# Altium footprint library Transformers.PcbLib: 81 footprints (part 3 of 6) (continued)
## XFMR_EDA-01905-V1-0_misc5 [mm] "ETD39 Core + Coil Former + Yoke" (continued)
3D body "XFMR_EDA-01905-V1-0_misc5.stp": height 35.5, standoff -4.5, extent -22.5,-23.64 22.6,23.4

## XFMR_EDA-02116-V1-0_misc1 [mm] "Transformer D40 x L 65.5"
height 40
Top Overlay:
  lines w0.2: -32.3,-11.45 -57.3,-11.45 -57.3,-7.75 -32.3,-7.75 ; -32.3,3.75 -42,3.75 -42,4.65 -32.3,4.65 ; -32.3,10.35 -42,10.35 -42,11.25 -32.3,11.25 ; -32.3,-20.25 33.3,-20.25 33.3,20.25 -32.3,20.25 -32.3,-20.25
  text "CATHODE" at -42,5.4 h1.5
  text "GATE" at -39.75,12 h1.5
Top Solder:
  lines w1.27: -23.5,-13.51 ccw(c-23,-13.51) -23,-14.01 -16,-14.01 ccw(c-16,-13.51) -15.5,-13.51 -15.5,-11.51 ccw(c-16,-11.51) -16,-11.01 -23,-11.01 ccw(c-23,-11.51) -23.5,-11.51 -23.5,-13.51 ; -23.5,11.49 ccw(c-23,11.49) -23,10.99 -16,10.99 ccw(c-16,11.49) -15.5,11.49 -15.5,13.49 ccw(c-16,13.49) -16,13.99 -23,13.99 ccw(c-23,13.49) -23.5,13.49 -23.5,11.49 ; 16.5,-13.51 ccw(c17,-13.51) 17,-14.01 24,-14.01 ccw(c24,-13.51) 24.5,-13.51 24.5,-11.51 ccw(c24,-11.51) 24,-11.01 17,-11.01 ccw(c17,-11.51) 16.5,-11.51 16.5,-13.51 ; 16.5,11.49 ccw(c17,11.49) 17,10.99 24,10.99 ccw(c24,11.49) 24.5,11.49 24.5,13.49 ccw(c24,13.49) 24,13.99 17,13.99 ccw(c17,13.49) 16.5,13.49 16.5,11.49
Bottom Solder:
  lines w1.27: -23.5,-13.51 ccw(c-23,-13.51) -23,-14.01 -16,-14.01 ccw(c-16,-13.51) -15.5,-13.51 -15.5,-11.51 ccw(c-16,-11.51) -16,-11.01 -23,-11.01 ccw(c-23,-11.51) -23.5,-11.51 -23.5,-13.51 ; -23.5,11.49 ccw(c-23,11.49) -23,10.99 -16,10.99 ccw(c-16,11.49) -15.5,11.49 -15.5,13.49 ccw(c-16,13.49) -16,13.99 -23,13.99 ccw(c-23,13.49) -23.5,13.49 -23.5,11.49 ; 16.5,-13.51 ccw(c17,-13.51) 17,-14.01 24,-14.01 ccw(c24,-13.51) 24.5,-13.51 24.5,-11.51 ccw(c24,-11.51) 24,-11.01 17,-11.01 ccw(c17,-11.51) 16.5,-11.51 16.5,-13.51 ; 16.5,11.49 ccw(c17,11.49) 17,10.99 24,10.99 ccw(c24,11.49) 24.5,11.49 24.5,13.49 ccw(c24,13.49) 24,13.99 17,13.99 ccw(c17,13.49) 16.5,13.49 16.5,11.49
Keep-Out Layer:
  board cut-out: -23,11 -23.099,11 -23.283,11.076 -23.424,11.217 -23.5,11.401 -23.5,11.5 -23.5,13.5 -23.5,13.599 -23.424,13.783 -23.283,13.924 -23.099,14 -23,14 -16,14 -15.901,14 -15.717,13.924 -15.576,13.783 -15.5,13.599 -15.5,13.5 -15.5,11.5 -15.5,11.401 -15.576,11.217 -15.717,11.076 -15.901,11 -16,11
  board cut-out: 17,11 16.901,11 16.717,11.076 16.576,11.217 16.5,11.401 16.5,11.5 16.5,13.5 16.5,13.599 16.576,13.783 16.717,13.924 16.901,14 17,14 24,14 24.099,14 24.283,13.924 24.424,13.783 24.5,13.599 24.5,13.5 24.5,11.5 24.5,11.401 24.424,11.217 24.283,11.076 24.099,11 24,11
  board cut-out: 17,-14 16.901,-14 16.717,-13.924 16.576,-13.783 16.5,-13.599 16.5,-13.5 16.5,-11.5 16.5,-11.401 16.576,-11.217 16.717,-11.076 16.901,-11 17,-11 24,-11 24.099,-11 24.283,-11.076 24.424,-11.217 24.5,-11.401 24.5,-11.5 24.5,-13.5 24.5,-13.599 24.424,-13.783 24.283,-13.924 24.099,-14 24,-14
  board cut-out: -23,-14 -23.099,-14 -23.283,-13.924 -23.424,-13.783 -23.5,-13.599 -23.5,-13.5 -23.5,-11.5 -23.5,-11.401 -23.424,-11.217 -23.283,-11.076 -23.099,-11 -23,-11 -16,-11 -15.901,-11 -15.717,-11.076 -15.576,-11.217 -15.5,-11.401 -15.5,-11.5 -15.5,-13.5 -15.5,-13.599 -15.576,-13.783 -15.717,-13.924 -15.901,-14 -16,-14
Mechanical 1:
  lines w1.27: -23.5,-13.5 ccw(c-23,-13.5) -23,-14 -16,-14 ccw(c-16,-13.5) -15.5,-13.5 -15.5,-11.5 ccw(c-16,-11.5) -16,-11 -23,-11 ccw(c-23,-11.5) -23.5,-11.5 -23.5,-13.5 ; -23.5,11.5 ccw(c-23,11.5) -23,11 -16,11 ccw(c-16,11.5) -15.5,11.5 -15.5,13.5 ccw(c-16,13.5) -16,14 -23,14 ccw(c-23,13.5) -23.5,13.5 -23.5,11.5 ; 16.5,-13.5 ccw(c17,-13.5) 17,-14 24,-14 ccw(c24,-13.5) 24.5,-13.5 24.5,-11.5 ccw(c24,-11.5) 24,-11 17,-11 ccw(c17,-11.5) 16.5,-11.5 16.5,-13.5 ; 16.5,11.5 ccw(c17,11.5) 17,11 24,11 ccw(c24,11.5) 24.5,11.5 24.5,13.5 ccw(c24,13.5) 24,14 17,14 ccw(c17,13.5) 16.5,13.5 16.5,11.5
Mechanical 8:
  lines w0.1: -20,-12.5 -19.5,-12.5 ; -20,12.5 -19.5,12.5 ; -19.5,-13 -19.5,-12.5 ; -19.5,-12 -19.5,-12.5 ; -19.5,12 -19.5,12.5 ; -19.5,13 -19.5,12.5 ; -19,-12.5 -19.5,-12.5 ; -19,12.5 -19.5,12.5 ; -0.5,0 0,0 ; 0,-0.5 0,0 ; 0,0.5 0,0 ; 0.5,0 0,0 ; 20,-12.5 20.5,-12.5 ; 20,12.5 20.5,12.5 ; 20.5,-13 20.5,-12.5 ; 20.5,-12 20.5,-12.5 ; 20.5,12 20.5,12.5 ; 20.5,13 20.5,12.5 ; 21,-12.5 20.5,-12.5 ; 21,12.5 20.5,12.5
Mechanical 14:
  lines w0.1: -32.3,-11.45 -57.3,-11.45 -57.3,-7.75 -32.3,-7.75 ; -32.3,3.75 -42,3.75 -42,4.65 -32.3,4.65 ; -32.3,10.35 -42,10.35 -42,11.25 -32.3,11.25 ; -32.3,-20.25 33.3,-20.25 33.3,20.25 -32.3,20.25 -32.3,-20.25 ; -23.5,-13.5 ccw(c-23,-13.5) -23,-14 -16,-14 ccw(c-16,-13.5) -15.5,-13.5 -15.5,-11.5 ccw(c-16,-11.5) -16,-11 -23,-11 ccw(c-23,-11.5) -23.5,-11.5 -23.5,-13.5 ; -23.5,11.5 ccw(c-23,11.5) -23,11 -16,11 ccw(c-16,11.5) -15.5,11.5 -15.5,13.5 ccw(c-16,13.5) -16,14 -23,14 ccw(c-23,13.5) -23.5,13.5 -23.5,11.5 ; 16.5,-13.5 ccw(c17,-13.5) 17,-14 24,-14 ccw(c24,-13.5) 24.5,-13.5 24.5,-11.5 ccw(c24,-11.5) 24,-11 17,-11 ccw(c17,-11.5) 16.5,-11.5 16.5,-13.5 ; 16.5,11.5 ccw(c17,11.5) 17,11 24,11 ccw(c24,11.5) 24.5,11.5 24.5,13.5 ccw(c24,13.5) 24,14 17,14 ccw(c17,13.5) 16.5,13.5 16.5,11.5
  text "CATHODE" at -42,5.4 h1.5
  text "GATE" at -39.75,12 h1.5
Drill Drawing:
  lines w0.1: -28.5,-12.5 -20.5,-12.5 ; -28.5,12.5 -20.5,12.5 ; -27.842,-11.56 -27.5,-12.5 ; -27.842,11.56 -27.5,12.5 ; -27.158,-11.56 -27.5,-12.5 ; -27.158,11.56 -27.5,12.5 ; -20,-12.5 -19.5,-12.5 ; -20,12.5 -19.5,12.5 ; -19.5,-18.5 -19.5,-13.5 ; -19.5,-13 -19.5,-12.5 ; -19.5,-12 -19.5,-12.5 ; -19.5,-11.5 -19.5,11.5 ; -19.5,12 -19.5,12.5 ; -19.5,13 -19.5,12.5 ; -19,-12.5 -19.5,-12.5 ; -19,12.5 -19.5,12.5 ; -18.56,-17.842 -19.5,-17.5 ; -18.56,-17.158 -19.5,-17.5 ; -18.5,-12.5 19.5,-12.5 ; -18.5,12.5 19.5,12.5 ; -0.5,0 0,0 ; 0,-0.5 0,0 ; 0,0.5 0,0 ; 0.5,0 0,0 ; 14.5,11 16.5,11 ; 14.5,14 16.5,14 16.5,16 ; 14.658,10.06 15,11 15.342,10.06 ; 14.658,14.94 15,14 15.342,14.94 ; 15,10.06 15,14.94 ; 15.56,15.158 16.5,15.5 15.56,15.842 ; 15.56,15.5 25.44,15.5 ; 19.56,-17.842 20.5,-17.5 ; 19.56,-17.158 20.5,-17.5 ; 20,-12.5 20.5,-12.5 ; 20,12.5 20.5,12.5 ; 20.5,-18.5 20.5,-13.5 ; 20.5,-13 20.5,-12.5 ; 20.5,-12 20.5,-12.5 ; 20.5,-11.5 20.5,11.5 ; 20.5,12 20.5,12.5 ; 20.5,13 20.5,12.5 ; 21,-12.5 20.5,-12.5 ; 21,12.5 20.5,12.5 ; 23.447,11.569 24.354,11.146 ; 23.931,12.053 24.354,11.146 ; 24.5,14 24.5,16 ; 25.44,15.158 24.5,15.5 25.44,15.842 ; 27.636,12.598 22.902,12.598 24.354,11.146 ; -27.5,-12.5 -27.5,12.5 ; -19.5,-17.5 20.5,-17.5 ; -23.5,-13.5 ccw(c-23,-13.5) -23,-14 -16,-14 ccw(c-16,-13.5) -15.5,-13.5 -15.5,-11.5 ccw(c-16,-11.5) -16,-11 -23,-11 ccw(c-23,-11.5) -23.5,-11.5 -23.5,-13.5 ; -23.5,11.5 ccw(c-23,11.5) -23,11 -16,11 ccw(c-16,11.5) -15.5,11.5 -15.5,13.5 ccw(c-16,13.5) -16,14 -23,14 ccw(c-23,13.5) -23.5,13.5 -23.5,11.5 ; 16.5,-13.5 ccw(c17,-13.5) 17,-14 24,-14 ccw(c24,-13.5) 24.5,-13.5 24.5,-11.5 ccw(c24,-11.5) 24,-11 17,-11 ccw(c17,-11.5) 16.5,-11.5 16.5,-13.5 ; 16.5,11.5 ccw(c17,11.5) 17,11 24,11 ccw(c24,11.5) 24.5,11.5 24.5,13.5 ccw(c24,13.5) 24,14 17,14 ccw(c17,13.5) 16.5,13.5 16.5,11.5
  text "3" at 14.741,11.395 h1
  text "8" at 20.15,15.759 h1
  text "r0.5" at 25.074,12.807 h1
  text "25" at -27.759,-0.708 h1
  text "40" at -0.25,-17.241 h1
3D body "XFMR_EDA-02116_misc1.stp": height 41.07, standoff -8, extent -64.15,-20.25 33.3,28.71

## XFMR_EDA-03141-V2-0_misc1 [mm]
height 9.8
pads (4):
  round 3.3 hole 2.6: 1(-10,0) 2(10,0)
  round 2 hole 1.3: 3(-22.5,0) 4(22.5,0)
Top Overlay:
  lines w0.2: -21.5,-1.118 -21.5,-1.4 -11.632,-1.4 ; -21.5,1.118 -21.5,1.4 -11.632,1.4 ; -9.211,-2 -8.5,-2 ; -9.211,2 -8.5,2 ; -8.5,-1.54 -8.5,-2.5 -6.95,-2.5 ; -8.5,1.54 -8.5,2.5 -6.95,2.5 ; -3.55,-2.5 -3.45,-2.5 ; -3.55,2.5 -3.45,2.5 ; -0.05,-2.5 0.05,-2.5 ; -0.05,2.5 0.05,2.5 ; 3.45,-2.5 3.55,-2.5 ; 3.45,2.5 3.55,2.5 ; 6.95,-2.5 8.5,-2.5 8.5,-1.54 ; 6.95,2.5 8.5,2.5 8.5,1.54 ; 8.5,-2 9.211,-2 ; 8.5,2 9.211,2 ; 11.632,-1.4 21.5,-1.4 21.5,-1.118 ; 11.632,1.4 21.5,1.4 21.5,1.118 ; -6.95,-4.45 ccw(c-6.65,-4.45) -6.65,-4.75 -3.85,-4.75 ccw(c-3.85,-4.45) -3.55,-4.45 -3.55,4.45 ccw(c-3.85,4.45) -3.85,4.75 -6.65,4.75 ccw(c-6.65,4.45) -6.95,4.45 -6.95,-4.45 ; -3.45,-4.45 ccw(c-3.15,-4.45) -3.15,-4.75 -0.35,-4.75 ccw(c-0.35,-4.45) -0.05,-4.45 -0.05,4.45 ccw(c-0.35,4.45) -0.35,4.75 -3.15,4.75 ccw(c-3.15,4.45) -3.45,4.45 -3.45,-4.45 ; 0.05,-4.45 ccw(c0.35,-4.45) 0.35,-4.75 3.15,-4.75 ccw(c3.15,-4.45) 3.45,-4.45 3.45,4.45 ccw(c3.15,4.45) 3.15,4.75 0.35,4.75 ccw(c0.35,4.45) 0.05,4.45 0.05,-4.45 ; 3.55,-4.45 ccw(c3.85,-4.45) 3.85,-4.75 6.65,-4.75 ccw(c6.65,-4.45) 6.95,-4.45 6.95,4.45 ccw(c6.65,4.45) 6.65,4.75 3.85,4.75 ccw(c3.85,4.45) 3.55,4.45 3.55,-4.45
  text "1" at -10.35,2.8 h1.5
  text "3" at -20.75,-0.7 h1.5
  text "2" at 9.65,2.8 h1.5
  text "4" at 19.65,-0.7 h1.5
Mechanical 8:
  circle w0.1: c-10,0 r1.3
  circle w0.1: c-22.5,0 r0.65
  circle w0.1: c10,0 r1.3
  circle w0.1: c22.5,0 r0.65
  circle w0.1: c22.5,0 r1
  circle w0.1: c-22.5,0 r1
  circle w0.1: c-10,0 r1.65
  circle w0.1: c10,0 r1.65
  lines w0.1: -23,0 -22.5,0 ; -22.5,-0.5 -22.5,0 ; -22.5,0.5 -22.5,0 ; -22,0 -22.5,0 ; -10.5,0 -10,0 ; -10,-0.5 -10,0 ; -10,0.5 -10,0 ; -9.5,0 -10,0 ; -0.5,0 0,0 ; 0,-0.5 0,0 ; 0,0.5 0,0 ; 0.5,0 0,0 ; 9.5,0 10,0 ; 10,-0.5 10,0 ; 10,0.5 10,0 ; 10.5,0 10,0 ; 22,0 22.5,0 ; 22.5,-0.5 22.5,0 ; 22.5,0.5 22.5,0 ; 23,0 22.5,0
Mechanical 14:
  lines w0.1: -21.5,-0.5 -22.5,-0.5 cw(c-22.5,0) -22.5,0.5 -21.5,0.5 ; -9.9,-1.4 -21.5,-1.4 -21.5,1.4 -9.9,1.4 ; -8.5,-2 -9.9,-2 -9.9,2 -8.5,2 ; -6.95,-2.5 -8.5,-2.5 -8.5,2.5 -6.95,2.5 ; -3.55,-2.5 -3.45,-2.5 ; -3.55,2.5 -3.45,2.5 ; -0.05,-2.5 0.05,-2.5 ; -0.05,2.5 0.05,2.5 ; 3.45,-2.5 3.55,-2.5 ; 3.45,2.5 3.55,2.5 ; 6.95,-2.5 8.5,-2.5 8.5,2.5 6.95,2.5 ; 8.5,-2 9.9,-2 9.9,2 8.5,2 ; 9.9,-1.4 21.5,-1.4 21.5,1.4 9.9,1.4 ; 21.5,-0.5 22.5,-0.5 ccw(c22.5,0) 22.5,0.5 21.5,0.5 ; -6.95,-4.45 ccw(c-6.65,-4.45) -6.65,-4.75 -3.85,-4.75 ccw(c-3.85,-4.45) -3.55,-4.45 -3.55,4.45 ccw(c-3.85,4.45) -3.85,4.75 -6.65,4.75 ccw(c-6.65,4.45) -6.95,4.45 -6.95,-4.45 ; -3.45,-4.45 ccw(c-3.15,-4.45) -3.15,-4.75 -0.35,-4.75 ccw(c-0.35,-4.45) -0.05,-4.45 -0.05,4.45 ccw(c-0.35,4.45) -0.35,4.75 -3.15,4.75 ccw(c-3.15,4.45) -3.45,4.45 -3.45,-4.45 ; 0.05,-4.45 ccw(c0.35,-4.45) 0.35,-4.75 3.15,-4.75 ccw(c3.15,-4.45) 3.45,-4.45 3.45,4.45 ccw(c3.15,4.45) 3.15,4.75 0.35,4.75 ccw(c0.35,4.45) 0.05,4.45 0.05,-4.45 ; 3.55,-4.45 ccw(c3.85,-4.45) 3.85,-4.75 6.65,-4.75 ccw(c6.65,-4.45) 6.95,-4.45 6.95,4.45 ccw(c6.65,4.45) 6.65,4.75 3.85,4.75 ccw(c3.85,4.45) 3.55,4.45 3.55,-4.45
  text "1" at -10.35,2.8 h1.5
  text "3" at -20.75,-0.7 h1.5
  text "2" at 9.65,2.8 h1.5
  text "4" at 19.65,-0.7 h1.5
3D body "XFMR_EDA-03141-V1-0_misc1.stp": height 9.49, standoff -3.6, extent -22.996,-4.712 22.996,4.75

## XFMR_EDA-03141-V2-0_misc1_a [mm]
height 9.8
pads (2):
  round 3.3 hole 2.6: 1(-10,0) 2(10,0)
Top Overlay:
  lines w0.2: -21.5,-0.5 ccw(c-21.5,-1) -22,-1 -22,-8.35 -23,-8.35 -23,-1 cw(c-21.5,-1) -21.5,0.5 ; -11.632,-1.4 -21.5,-1.4 -21.5,1.4 -11.632,1.4 ; -9.211,-2 -8.5,-2 ; -9.211,2 -8.5,2 ; -8.5,-1.54 -8.5,-2.5 -6.95,-2.5 ; -8.5,1.54 -8.5,2.5 -6.95,2.5 ; -3.55,-2.5 -3.45,-2.5 ; -3.55,2.5 -3.45,2.5 ; -0.05,-2.5 0.05,-2.5 ; -0.05,2.5 0.05,2.5 ; 3.45,-2.5 3.55,-2.5 ; 3.45,2.5 3.55,2.5 ; 6.95,-2.5 8.5,-2.5 8.5,-1.54 ; 6.95,2.5 8.5,2.5 8.5,1.54 ; 8.5,-2 9.211,-2 ; 8.5,2 9.211,2 ; 11.632,-1.4 21.5,-1.4 21.5,1.4 11.632,1.4 ; 21.5,-0.5 cw(c21.5,-1) 22,-1 22,-8.35 23,-8.35 23,-1 ccw(c21.5,-1) 21.5,0.5 ; -6.95,-4.45 ccw(c-6.65,-4.45) -6.65,-4.75 -3.85,-4.75 ccw(c-3.85,-4.45) -3.55,-4.45 -3.55,4.45 ccw(c-3.85,4.45) -3.85,4.75 -6.65,4.75 ccw(c-6.65,4.45) -6.95,4.45 -6.95,-4.45 ; -3.45,-4.45 ccw(c-3.15,-4.45) -3.15,-4.75 -0.35,-4.75 ccw(c-0.35,-4.45) -0.05,-4.45 -0.05,4.45 ccw(c-0.35,4.45) -0.35,4.75 -3.15,4.75 ccw(c-3.15,4.45) -3.45,4.45 -3.45,-4.45 ; 0.05,-4.45 ccw(c0.35,-4.45) 0.35,-4.75 3.15,-4.75 ccw(c3.15,-4.45) 3.45,-4.45 3.45,4.45 ccw(c3.15,4.45) 3.15,4.75 0.35,4.75 ccw(c0.35,4.45) 0.05,4.45 0.05,-4.45 ; 3.55,-4.45 ccw(c3.85,-4.45) 3.85,-4.75 6.65,-4.75 ccw(c6.65,-4.45) 6.95,-4.45 6.95,4.45 ccw(c6.65,4.45) 6.65,4.75 3.85,4.75 ccw(c3.85,4.45) 3.55,4.45 3.55,-4.45
  text "1" at -10.35,2.8 h1.5
  text "2" at 9.65,2.8 h1.5
Mechanical 8:
  circle w0.1: c-10,0 r1.3
  circle w0.1: c10,0 r1.3
  circle w0.1: c-10,0 r1.65
  circle w0.1: c10,0 r1.65
  lines w0.1: -10.5,0 -10,0 ; -10,-0.5 -10,0 ; -10,0.5 -10,0 ; -9.5,0 -10,0 ; -0.5,0 0,0 ; 0,-0.5 0,0 ; 0,0.5 0,0 ; 0.5,0 0,0 ; 9.5,0 10,0 ; 10,-0.5 10,0 ; 10,0.5 10,0 ; 10.5,0 10,0
Mechanical 14:
  lines w0.1: -21.5,-0.5 ccw(c-21.5,-1) -22,-1 -22,-8.35 -23,-8.35 -23,-1 cw(c-21.5,-1) -21.5,0.5 ; -9.9,-1.4 -21.5,-1.4 -21.5,1.4 -9.9,1.4 ; -8.5,-2 -9.9,-2 -9.9,2 -8.5,2 ; -6.95,-2.5 -8.5,-2.5 -8.5,2.5 -6.95,2.5 ; -3.55,-2.5 -3.45,-2.5 ; -3.55,2.5 -3.45,2.5 ; -0.05,-2.5 0.05,-2.5 ; -0.05,2.5 0.05,2.5 ; 3.45,-2.5 3.55,-2.5 ; 3.45,2.5 3.55,2.5 ; 6.95,-2.5 8.5,-2.5 8.5,2.5 6.95,2.5 ; 8.5,-2 9.9,-2 9.9,2 8.5,2 ; 9.9,-1.4 21.5,-1.4 21.5,1.4 9.9,1.4 ; 21.5,-0.5 cw(c21.5,-1) 22,-1 22,-8.35 23,-8.35 23,-1 ccw(c21.5,-1) 21.5,0.5 ; -6.95,-4.45 ccw(c-6.65,-4.45) -6.65,-4.75 -3.85,-4.75 ccw(c-3.85,-4.45) -3.55,-4.45 -3.55,4.45 ccw(c-3.85,4.45) -3.85,4.75 -6.65,4.75 ccw(c-6.65,4.45) -6.95,4.45 -6.95,-4.45 ; -3.45,-4.45 ccw(c-3.15,-4.45) -3.15,-4.75 -0.35,-4.75 ccw(c-0.35,-4.45) -0.05,-4.45 -0.05,4.45 ccw(c-0.35,4.45) -0.35,4.75 -3.15,4.75 ccw(c-3.15,4.45) -3.45,4.45 -3.45,-4.45 ; 0.05,-4.45 ccw(c0.35,-4.45) 0.35,-4.75 3.15,-4.75 ccw(c3.15,-4.45) 3.45,-4.45 3.45,4.45 ccw(c3.15,4.45) 3.15,4.75 0.35,4.75 ccw(c0.35,4.45) 0.05,4.45 0.05,-4.45 ; 3.55,-4.45 ccw(c3.85,-4.45) 3.85,-4.75 6.65,-4.75 ccw(c6.65,-4.45) 6.95,-4.45 6.95,4.45 ccw(c6.65,4.45) 6.65,4.75 3.85,4.75 ccw(c3.85,4.45) 3.55,4.45 3.55,-4.45
  text "1" at -10.35,2.8 h1.5
  text "2" at 9.65,2.8 h1.5
3D body "XFMR_EDA-03141-V1-0_misc1_a.stp": height 9.49, standoff -3.6, extent -22.996,-8.35 22.996,4.75

## XFMR_ERA_030-7234.0 [mm] "EI30/10.5 1VA Low Power Encapsulated Transformer"
height 22.8
pads (4):
  round 1.8 hole 1.1: 1(-10,10) 5(-10,-10) 7(10,-5) 9(10,5)
Top Overlay:
  circle w0.3: c6,-3 r0.15
  circle w0.3: c-6,5 r0.15
  lines w0.2: -7,-7.5 -7,-3.75 ccw(c-7,-3) -7,-2.25 ccw(c-7,-1.5) -7,-0.75 ccw(c-7,0) -7,0.75 ccw(c-7,1.5) -7,2.25 ccw(c-7,3) -7,3.75 -7,7.5 ; -0.5,-5 -0.5,5 ; 0.5,-5 0.5,5 ; 7,-3.5 7,-2.25 cw(c7,-1.5) 7,-0.75 cw(c7,0) 7,0.75 cw(c7,1.5) 7,2.25 7,3.5 ; -13.9,-15.4 ccw(c-12.9,-15.4) -12.9,-16.4 12.9,-16.4 ccw(c12.9,-15.4) 13.9,-15.4 13.9,15.4 ccw(c12.9,15.4) 12.9,16.4 -12.9,16.4 ccw(c-12.9,15.4) -13.9,15.4 -13.9,-15.4
  text "5" at -6.25,-10.5 h1.5
  text "1" at -6.25,9.8 h1.5
  text "7" at 7.75,-6.5 h1.5
  text "9" at 7.75,5.55 h1.5
  text "SEC" at 5.5,-1.4 h1.2
  text "PRIM" at -4.3,-1.7 h1.2
Mechanical 8:
  lines w0.05: -10.5,-10 -10,-10 ; -10.5,10 -10,10 ; -10,-10.5 -10,-10 ; -10,-9.5 -10,-10 ; -10,9.5 -10,10 ; -10,10.5 -10,10 ; -9.5,-10 -10,-10 ; -9.5,10 -10,10 ; 9.5,-5 10,-5 ; 9.5,5 10,5 ; 10,-5.5 10,-5 ; 10,-4.5 10,-5 ; 10,4.5 10,5 ; 10,5.5 10,5 ; 10.5,-5 10,-5 ; 10.5,5 10,5
  lines w0.1: -0.5,0 0,0 ; 0,-0.5 0,0 ; 0,0.5 0,0 ; 0.5,0 0,0
Mechanical 14:
  circle w0.3: c6,-3 r0.15
  circle w0.3: c-6,5 r0.15
  lines w0.1: -7,-7.5 -7,-3.75 ccw(c-7,-3) -7,-2.25 ccw(c-7,-1.5) -7,-0.75 ccw(c-7,0) -7,0.75 ccw(c-7,1.5) -7,2.25 ccw(c-7,3) -7,3.75 -7,7.5 ; -0.5,-5 -0.5,5 ; 0.5,-5 0.5,5 ; 7,-3.5 7,-2.25 cw(c7,-1.5) 7,-0.75 cw(c7,0) 7,0.75 cw(c7,1.5) 7,2.25 7,3.5 ; -13.9,-15.4 ccw(c-12.9,-15.4) -12.9,-16.4 12.9,-16.4 ccw(c12.9,-15.4) 13.9,-15.4 13.9,15.4 ccw(c12.9,15.4) 12.9,16.4 -12.9,16.4 ccw(c-12.9,15.4) -13.9,15.4 -13.9,-15.4 ; -9.3,-10.8 ccw(c-8.3,-10.8) -8.3,-11.8 8.3,-11.8 ccw(c8.3,-10.8) 9.3,-10.8 9.3,10.8 ccw(c8.3,10.8) 8.3,11.8 -8.3,11.8 ccw(c-8.3,10.8) -9.3,10.8 -9.3,-10.8
  text "9" at 7.75,5.55 h1.5
  text "7" at 7.75,-6.5 h1.5
  text "1" at -6.25,9.8 h1.5
  text "5" at -6.25,-10.5 h1.5
  text "SEC" at 5.5,-1.4 h1.2
  text "PRIM" at -4.3,-1.7 h1.2
3D body "XFMR_ERA_030-7234.0.stp": height 22.8, standoff -3.5, extent -13.9,-16.4 13.9,16.4

## XFMR_ERA_054-5205.0 [mm] "ERA EI54/18.8 16VA Low Power Encapsulated Transformer, Body 57.1mm x 48mm"
height 39.1
pads (6):
  round 1.8 hole 1.1: 1(-15,15.12) 7(-15,-15.12) 8(15,-15.12) 9(15,-10.08) 13(15,10.08) 14(15,15.12)
Top Overlay:
  circle w0.3: c-11,6 r0.15
  circle w0.3: c11,-6 r0.15
  lines w0.2: -16,-16.736 -16,-20.55 16,-20.55 16,-16.736 ; -16,-13.505 -16,13.504 ; -16,16.735 -16,20.55 16,20.55 16,16.735 ; -12,-13.5 -12,-5.25 ccw(c-12,-4.5) -12,-3.75 ccw(c-12,-3) -12,-2.25 ccw(c-12,-1.5) -12,-0.75 ccw(c-12,0) -12,0.75 ccw(c-12,1.5) -12,2.25 ccw(c-12,3) -12,3.75 ccw(c-12,4.5) -12,5.25 -12,13.5 ; -0.5,-5 -0.5,5 ; 0.5,-5 0.5,5 ; 12,-8.5 12,-5.25 cw(c12,-4.5) 12,-3.75 cw(c12,-3) 12,-2.25 cw(c12,-1.5) 12,-0.75 cw(c12,0) 12,0.75 cw(c12,1.5) 12,2.25 cw(c12,3) 12,3.75 cw(c12,4.5) 12,5.25 12,8.5 ; 16,-13.505 16,-11.696 ; 16,-8.465 16,8.464 ; 16,11.695 16,13.504 ; -24,-27.55 ccw(c-23,-27.55) -23,-28.55 23,-28.55 ccw(c23,-27.55) 24,-27.55 24,27.55 ccw(c23,27.55) 23,28.55 -23,28.55 ccw(c-23,27.55) -24,27.55 -24,-27.55
  text "SEC" at 10.4,-1.6 h1.2
  text "14" at 11.8,14.6 h1
  text "13" at 11.8,9.6 h1
  text "9" at 12.5,-10.6 h1
  text "8" at 12.5,-15.6 h1
  text "7" at -13.2,-15.64 h1
  text "1" at -13.2,14.6 h1
  text "PRIM" at -9.3,-1.6 h1.2
Mechanical 8:
  lines w0.05: -15.5,-15.12 -15,-15.12 ; -15.5,15.12 -15,15.12 ; -15,-15.62 -15,-15.12 ; -15,-14.62 -15,-15.12 ; -15,14.62 -15,15.12 ; -15,15.62 -15,15.12 ; -14.5,-15.12 -15,-15.12 ; -14.5,15.12 -15,15.12 ; -1,0 1,0 ; 0,-1 0,1 ; 14.5,-15.12 15,-15.12 ; 14.5,-10.08 15,-10.08 ; 14.5,10.08 15,10.08 ; 14.5,15.12 15,15.12 ; 15,-15.62 15,-15.12 ; 15,-14.62 15,-15.12 ; 15,-10.58 15,-10.08 ; 15,-9.58 15,-10.08 ; 15,9.58 15,10.08 ; 15,10.58 15,10.08 ; 15,14.62 15,15.12 ; 15,15.62 15,15.12 ; 15.5,-15.12 15,-15.12 ; 15.5,-10.08 15,-10.08 ; 15.5,10.08 15,10.08 ; 15.5,15.12 15,15.12
Mechanical 14:
  circle w0.3: c11,-6 r0.15
  circle w0.3: c-11,6 r0.15
  lines w0.1: -12,-13.5 -12,-5.25 ccw(c-12,-4.5) -12,-3.75 ccw(c-12,-3) -12,-2.25 ccw(c-12,-1.5) -12,-0.75 ccw(c-12,0) -12,0.75 ccw(c-12,1.5) -12,2.25 ccw(c-12,3) -12,3.75 ccw(c-12,4.5) -12,5.25 -12,13.5 ; 12,-8.5 12,-5.25 cw(c12,-4.5) 12,-3.75 cw(c12,-3) 12,-2.25 cw(c12,-1.5) 12,-0.75 cw(c12,0) 12,0.75 cw(c12,1.5) 12,2.25 cw(c12,3) 12,3.75 cw(c12,4.5) 12,5.25 12,8.5 ; -24,-27.55 ccw(c-23,-27.55) -23,-28.55 23,-28.55 ccw(c23,-27.55) 24,-27.55 24,27.55 ccw(c23,27.55) 23,28.55 -23,28.55 ccw(c-23,27.55) -24,27.55 -24,-27.55 ; -16,-20.55 16,-20.55 16,20.55 -16,20.55 -16,-20.55
  lines w0.2: -0.5,-5 -0.5,5 ; 0.5,-5 0.5,5
  text "PRIM" at -9.3,-1.6 h1.2
  text "1" at -13.2,14.6 h1
  text "7" at -13.2,-15.64 h1
  text "8" at 12.5,-15.6 h1
  text "9" at 12.5,-10.6 h1
  text "13" at 11.8,9.6 h1
  text "14" at 11.8,14.6 h1
  text "SEC" at 10.4,-1.6 h1.2
3D body "XFMR_ERA_054-5205.stp": height 39.1, standoff -3.55, extent -24,-28.55 24,28.55

## XFMR_ERA_EE20 [mm] "EE20/10 0.5VA Mini-Line Encapsulated Transformer, Body 22.3mm x 23.5mm"
height 19.5
pads (6):
  round 1.6 hole 0.9: 1(-7.5,7.575) 4(-7.5,-7.575) 5(7.5,-7.575) 6(7.5,-2.525) 7(7.5,2.525) 8(7.5,7.575)
Top Overlay:
  circle w0.3: c-4.965,6 r0.15
  circle w0.3: c5.047,2.08 r0.15
  circle w0.3: c5.047,-8.08 r0.15
  lines w0.2: -11.75,-8.5 ccw(c-11.25,-8.5) -11.25,-9 11.25,-9 ccw(c11.25,-8.5) 11.75,-8.5 ; -11.75,8.5 cw(c-11.25,8.5) -11.25,9 11.25,9 cw(c11.25,8.5) 11.75,8.5 ; -5.965,-7.62 -5.965,-5.25 ccw(c-5.965,-4.5) -5.965,-3.75 ccw(c-5.965,-3) -5.965,-2.25 ccw(c-5.965,-1.5) -5.965,-0.75 ccw(c-5.965,0) -5.965,0.75 ccw(c-5.965,1.5) -5.965,2.25 ccw(c-5.965,3) -5.965,3.75 ccw(c-5.965,4.5) -5.965,5.25 -5.965,7.62 ; -0.5,-5 -0.5,5 ; 0.5,-5 0.5,5 ; 6.047,-7.62 6.047,-7.33 cw(c6.047,-6.58) 6.047,-5.83 cw(c6.047,-5.08) 6.047,-4.33 cw(c6.047,-3.58) 6.047,-2.83 6.047,-2.54 ; 6.047,2.54 6.047,2.83 cw(c6.047,3.58) 6.047,4.33 cw(c6.047,5.08) 6.047,5.83 cw(c6.047,6.58) 6.047,7.33 6.047,7.62 ; -11.75,-10.65 ccw(c-11.25,-10.65) -11.25,-11.15 11.25,-11.15 ccw(c11.25,-10.65) 11.75,-10.65 11.75,10.65 ccw(c11.25,10.65) 11.25,11.15 -11.25,11.15 ccw(c-11.25,10.65) -11.75,10.65 -11.75,-10.65
  text "PRIM" at -3.265,-1.6 h1.2
  text "1" at -9.27,7.175 h1
  text "SEC" at 4.547,3.68 h1.2
  text "SEC" at 4.547,-6.48 h1.2
  text "4" at -9.588,-7.975 h1
  text "5" at 9.145,-7.975 h1
  text "6" at 9.145,-2.925 h1
  text "7" at 9.145,2.125 h1
  text "8" at 9.145,7.175 h1
Mechanical 8:
  lines w0.05: -8,-7.575 -7.5,-7.575 ; -8,7.575 -7.5,7.575 ; -7.5,-8.075 -7.5,-7.575 ; -7.5,-7.075 -7.5,-7.575 ; -7.5,7.075 -7.5,7.575 ; -7.5,8.075 -7.5,7.575 ; -7,-7.575 -7.5,-7.575 ; -7,7.575 -7.5,7.575 ; -0.5,0 0,0 ; 0,-0.5 0,0 ; 0,0.5 0,0 ; 0.5,0 0,0 ; 7,-7.575 7.5,-7.575 ; 7,-2.525 7.5,-2.525 ; 7,2.525 7.5,2.525 ; 7,7.575 7.5,7.575 ; 7.5,-8.075 7.5,-7.575 ; 7.5,-7.075 7.5,-7.575 ; 7.5,-3.025 7.5,-2.525 ; 7.5,-2.025 7.5,-2.525 ; 7.5,2.025 7.5,2.525 ; 7.5,3.025 7.5,2.525 ; 7.5,7.075 7.5,7.575 ; 7.5,8.075 7.5,7.575 ; 8,-7.575 7.5,-7.575 ; 8,-2.525 7.5,-2.525 ; 8,2.525 7.5,2.525 ; 8,7.575 7.5,7.575
Mechanical 14:
  circle w0.3: c-4.965,6 r0.15
  circle w0.3: c5.047,2.08 r0.15
  circle w0.3: c5.047,-8.08 r0.15
  lines w0.1: -11.75,-8.5 ccw(c-11.25,-8.5) -11.25,-9 11.25,-9 ccw(c11.25,-8.5) 11.75,-8.5 ; -11.75,8.5 cw(c-11.25,8.5) -11.25,9 11.25,9 cw(c11.25,8.5) 11.75,8.5 ; -5.965,-7.62 -5.965,-5.25 ccw(c-5.965,-4.5) -5.965,-3.75 ccw(c-5.965,-3) -5.965,-2.25 ccw(c-5.965,-1.5) -5.965,-0.75 ccw(c-5.965,0) -5.965,0.75 ccw(c-5.965,1.5) -5.965,2.25 ccw(c-5.965,3) -5.965,3.75 ccw(c-5.965,4.5) -5.965,5.25 -5.965,7.62 ; 6.047,-7.62 6.047,-7.33 cw(c6.047,-6.58) 6.047,-5.83 cw(c6.047,-5.08) 6.047,-4.33 cw(c6.047,-3.58) 6.047,-2.83 6.047,-2.54 ; 6.047,2.54 6.047,2.83 cw(c6.047,3.58) 6.047,4.33 cw(c6.047,5.08) 6.047,5.83 cw(c6.047,6.58) 6.047,7.33 6.047,7.62 ; -11.75,-10.65 ccw(c-11.25,-10.65) -11.25,-11.15 11.25,-11.15 ccw(c11.25,-10.65) 11.75,-10.65 11.75,10.65 ccw(c11.25,10.65) 11.25,11.15 -11.25,11.15 ccw(c-11.25,10.65) -11.75,10.65 -11.75,-10.65
  lines w0.2: -0.5,-5 -0.5,5 ; 0.5,-5 0.5,5
  text "PRIM" at -3.265,-1.6 h1.2
  text "1" at -9.27,7.175 h1
  text "SEC" at 4.547,3.68 h1.2
  text "SEC" at 4.547,-6.48 h1.2
  text "4" at -9.588,-7.975 h1
  text "5" at 9.145,-7.975 h1
  text "6" at 9.145,-2.925 h1
  text "7" at 9.145,2.125 h1
  text "8" at 9.145,7.175 h1
3D body "XFMR_ERA_EE20.stp": height 19.5, standoff -3.6, extent -11.75,-11.15 11.75,11.15

## XFMR_MA-COM_SM-22 (H260) [mm] "MA-COM E-Serie RF 1:1 Transmission Line Ttransformer 4.5-3000MHz"
height 2.6
pads (5):
  rect 0.76x1.4 smd: 1(-1.27,1.715) 2(0,1.715) 3(1.27,1.715) 4(1.27,-1.715) 5(-1.27,-1.715)
Top Overlay:
  circle w0.25: c-2.175,1.6 r0.125
  lines w0.2: -1.905,-0.615 -1.905,0.615 ; -0.49,-1.295 0.49,-1.295 ; 1.905,-0.615 1.905,0.615
Mechanical 8:
  lines w0.1: -1.77,-1.715 -1.27,-1.715 ; -1.77,1.715 -1.27,1.715 ; -1.27,-2.215 -1.27,-1.715 ; -1.27,-1.215 -1.27,-1.715 ; -1.27,1.215 -1.27,1.715 ; -1.27,2.215 -1.27,1.715 ; -0.77,-1.715 -1.27,-1.715 ; -0.77,1.715 -1.27,1.715 ; -0.5,0 0,0 ; -0.5,1.715 0,1.715 ; 0,-0.5 0,0 ; 0,0.5 0,0 ; 0,1.215 0,1.715 ; 0,2.215 0,1.715 ; 0.5,0 0,0 ; 0.5,1.715 0,1.715 ; 0.77,-1.715 1.27,-1.715 ; 0.77,1.715 1.27,1.715 ; 1.27,-2.215 1.27,-1.715 ; 1.27,-1.215 1.27,-1.715 ; 1.27,1.215 1.27,1.715 ; 1.27,2.215 1.27,1.715 ; 1.77,-1.715 1.27,-1.715 ; 1.77,1.715 1.27,1.715 ; -1.65,-2.415 -1.65,-1.015 -0.89,-1.015 -0.89,-2.415 -1.65,-2.415 ; -1.65,1.015 -0.89,1.015 -0.89,2.415 -1.65,2.415 -1.65,1.015 ; -0.38,1.015 0.38,1.015 0.38,2.415 -0.38,2.415 -0.38,1.015 ; 0.89,-2.415 0.89,-1.015 1.65,-1.015 1.65,-2.415 0.89,-2.415 ; 0.89,1.015 1.65,1.015 1.65,2.415 0.89,2.415 0.89,1.015
Mechanical 14:
  circle w0.25: c-2.175,1.6 r0.125
  lines w0.1: -1.905,-1.095 1.905,-1.095 ; -1.905,1.095 1.905,1.095 ; -1.625,-1.01 -0.915,-1.01 -0.915,-2.03 ; -0.915,1.01 -0.915,2.03 ; -0.355,1.01 -0.355,2.03 ; 1.65,-1.391 cw(c1.75,-1.395) 1.746,-1.295 ; 1.75,-1.295 1.905,-1.295 1.905,1.295 1.75,1.295 cw(c1.75,1.395) 1.65,1.395 ; -1.65,-1.395 ccw(c-1.75,-1.395) -1.75,-1.295 -1.905,-1.295 -1.905,1.295 -1.75,1.295 ccw(c-1.75,1.395) -1.65,1.395 ; -1.65,-1.395 -0.89,-1.395 ; -1.65,-1.395 -1.65,-1.905 -0.89,-1.905 -0.89,-1.395 ; -1.65,1.395 -1.65,1.905 -0.89,1.905 -0.89,1.395 ; -1.65,1.395 -0.89,1.395 ; -0.89,-1.395 cw(c-0.79,-1.395) -0.79,-1.295 0.79,-1.295 cw(c0.79,-1.395) 0.89,-1.395 ; -0.89,1.395 ccw(c-0.79,1.395) -0.79,1.295 -0.48,1.295 ccw(c-0.48,1.395) -0.38,1.395 ; -0.38,1.395 -0.38,1.905 0.38,1.905 0.38,1.395 ; -0.38,1.395 0.38,1.395 ; 0.38,1.395 ccw(c0.48,1.395) 0.48,1.295 0.79,1.295 ccw(c0.79,1.395) 0.89,1.395 ; 0.89,-1.395 1.65,-1.395 1.65,-1.905 0.89,-1.905 0.89,-1.395 ; 0.89,1.395 0.89,1.905 1.65,1.905 1.65,1.395 ; 0.89,1.395 1.65,1.395
Mechanical 15:
  lines w0.05: -2.155,-2.665 -2.155,2.665 2.155,2.665 2.155,-2.665 -2.155,-2.665
3D body "XFMR_MA-COM_SM-22 (H260).stp": height 2.6, standoff 0, extent -1.905,-1.905 1.905,1.905

## XFMR_MINI-CIRCUITS_AT224 [mm] "MINI-CIRCUITS RF Transformer, Case AT224 - Body 3.81X3.81mm"
height 3.81
pads (5):
  rect 0.76x1.65 smd: 1(-1.27,1.59) 2(0,1.59) 3(1.27,1.59) 4(1.27,-1.59) 6(-1.27,-1.59)
Top Overlay:
  circle w0.25: c-2.175,1.6 r0.125
  lines w0.2: -1.905,-0.365 1.905,-0.365 1.905,0.365 -1.905,0.365 -1.905,-0.365
Mechanical 8:
  lines w0.1: -1.27,-2.59 -1.27,-1.59 ; -1.27,-0.59 -1.27,-1.59 ; -1.27,0.59 -1.27,1.59 ; -1.27,2.59 -1.27,1.59 ; -1,0 0,0 ; -0.38,-0.765 0.38,-0.765 ; 0,-1 0,0 ; 0,0.59 0,1.59 0,2.59 ; 0,1 0,0 ; 1,0 0,0 ; 1.27,-2.59 1.27,-1.59 1.27,-0.59 ; 1.27,0.59 1.27,1.59 1.27,2.59 ; 1.65,-1.59 -1.27,-1.59 ; 1.65,1.59 -1.27,1.59 ; -1.65,-2.415 -0.89,-2.415 -0.89,-0.765 -1.65,-0.765 -1.65,-2.415 ; -1.65,0.765 -0.89,0.765 -0.89,2.415 -1.65,2.415 -1.65,0.765 ; -0.38,0.765 0.38,0.765 0.38,2.415 -0.38,2.415 -0.38,0.765 ; 0.89,-2.415 1.65,-2.415 1.65,-0.765 0.89,-0.765 0.89,-2.415 ; 0.89,0.765 1.65,0.765 1.65,2.415 0.89,2.415 0.89,0.765
Mechanical 14:
  circle w0.25: c-2.175,1.6 r0.125
  lines w0.1: -1.625,-1.905 -1.625,-1.145 -0.915,-1.145 -0.915,-1.905 ; -1.625,1.905 -1.625,1.145 -0.915,1.145 -0.915,1.905 ; -0.355,1.905 -0.355,1.145 0.355,1.145 0.355,1.905 ; 0.915,-1.905 0.915,-1.145 1.625,-1.145 1.625,-1.905 ; 0.915,1.905 0.915,1.145 1.625,1.145 1.625,1.905 ; -1.905,-1.905 1.905,-1.905 1.905,1.905 -1.905,1.905 -1.905,-1.905
Mechanical 15:
  lines w0.05: -2.155,-2.665 2.155,-2.665 2.155,2.665 -2.155,2.665 -2.155,-2.665
3D body "XFMR_MINI-CIRCUITS_AT224.stp": height 3.81, standoff 0, extent -1.905,-1.905 1.905,1.905